# Altium footprint library Footprints.PcbLib: 266 footprints (part 11 of 17)
Each footprint in its own frame and in the unit in brackets; x right, y up, seen from the top. Pads: shape width x height; smd on the part's side, far side on the other; paste and mask are expansions set on the pad; w line width, h text height; cw(c..) or ccw(c..) is an arc to the next point about the centre after c.
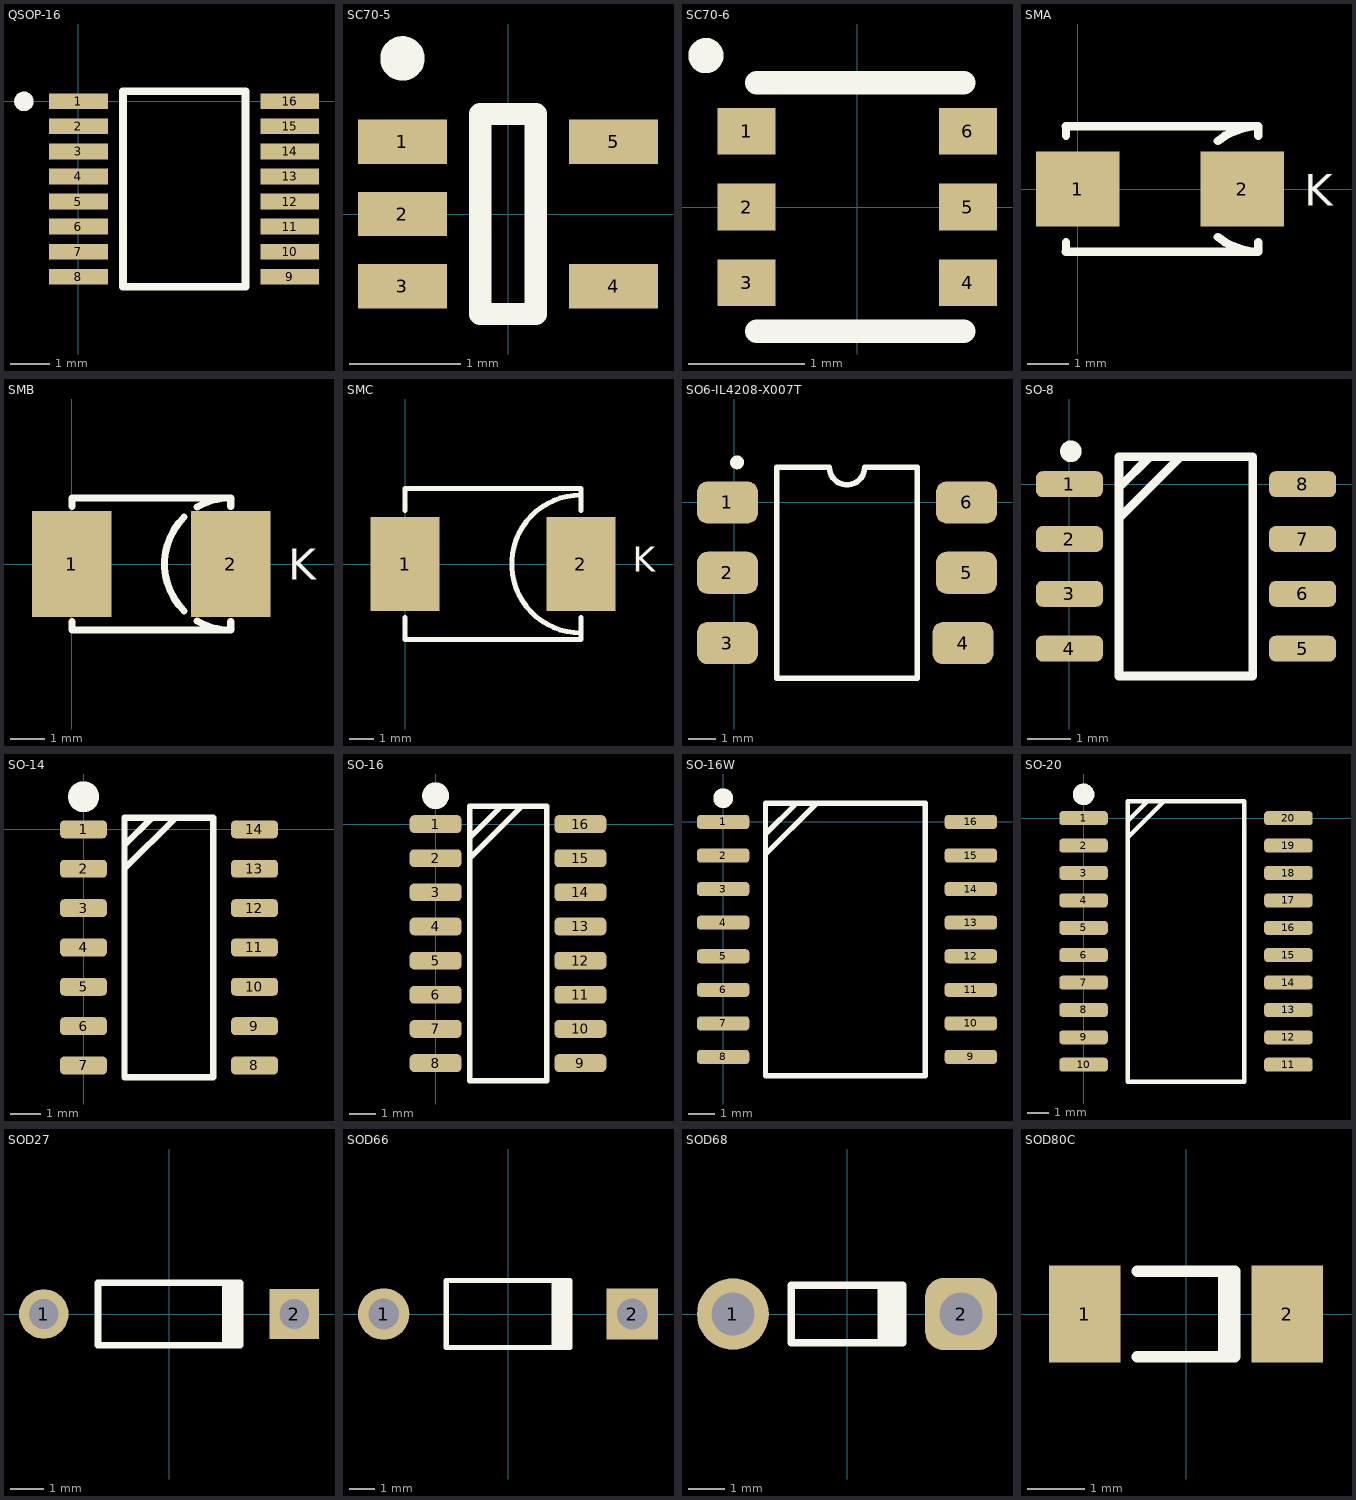
[diagram p10: the footprints below, top view; thin cyan lines are the x and y axes]

## QSOP-16 [mm] "QSOP, 16-Leads, Body 5.0x4.0mm (max), Pitch 0.64mm, IPC Medium Density"
height 1.75
pads (16):
  rect 1.5x0.4 smd: 1(0,0) 2(0,-0.64) 3(0,-1.28) 4(0,-1.92) 5(0,-2.56) 6(0,-3.2) 7(0,-3.84) 8(0,-4.48) 9(5.4,-4.48) 10(5.4,-3.84) 11(5.4,-3.2) 12(5.4,-2.56) 13(5.4,-1.92) 14(5.4,-1.28) 15(5.4,-0.64) 16(5.4,0)
Top Overlay:
  circle w0.25: c-1.395,0 r0.125
  lines w0.2: 1.143,-4.74 4.267,-4.74 4.267,0.26 1.143,0.26 1.143,-4.74
3D body "User Library-MAX_QSOP16.STEP": height 1.81, standoff 0.04, extent -0.292,-4.725 5.728,0.255

## SC70-5 [mm] "SC-70, 5-Leads"
height 1.1
pads (5):
  rect 0.8x0.4 smd: 1(-0.95,0.65) 2(-0.95,0) 3(-0.95,-0.65) 4(0.95,-0.65) 5(0.95,0.65)
Top Overlay:
  circle w0.2: c-0.95,1.4 r0.1
  lines w0.2: -0.25,-0.9 0.25,-0.9 0.25,0.9 -0.25,0.9 -0.25,-0.9
3D body "sot353.STEP": height 1, standoff 0, extent -1.15,-1.05 1.15,1.05

## SC70-6 [mm] "SC70-6, 6 pins, Height = 1mm"
height 1
pads (6):
  rect 0.5x0.4 smd: 1(-0.95,0.65) 2(-0.95,0) 3(-0.95,-0.65) 4(0.95,-0.65) 5(0.95,0) 6(0.95,0.65)
Top Overlay:
  circle w0.15: c-1.3,1.3 r0.076
  lines w0.2: -0.864,-1.067 0.914,-1.067 ; -0.864,1.067 0.914,1.067
3D body "SC70-6.STEP": height 0.92, standoff -0.03, extent -1.05,-1 1.05,1

## SMA [mm]
pads (2):
  rect 2x1.8 smd: 1(0,0) 2(3.937,0)
Top Overlay:
  lines w0.203: -0.282,-1.27 -0.282,-1.5 4.318,-1.5 ; -0.282,1.27 -0.282,1.5 4.318,1.5 ; 3.354,-1.149 ccw(c4.318,0) 4.318,-1.5 ; 3.354,1.149 cw(c4.318,0) 4.318,1.5 ; 4.318,-1.27 4.318,-1.5 ; 4.318,1.27 4.318,1.5
  text "K" at 5.42,-0.406 h0.76
3D body "SMA.STEP": height 2.4, standoff 0, extent -0.628,-1.321 4.572,1.279

## SMB [mil]
pads (2):
  rect 90x120 smd: 1(0,0) 2(180,0)
Top Overlay:
  lines w8: 0,-65 0,-75 180,-75 ; 0,65 0,75 180,75 ; 126.97,-53.03 cw(c180,0) 126.97,53.03 ; 142.02,-64.67 ccw(c180,0) 180,-75 ; 142.02,64.67 cw(c180,0) 180,75 ; 180,-65 180,-75 ; 180,65 180,75
  text "K" at 245,-18 h35
3D body "SMB.STEP": height 90.75, standoff 0, extent -14.6,-70 198,71.73

## SMC [mil]
pads (2):
  rect 110x150 smd: 1(0,0) 2(280,0)
Top Overlay:
  lines w8: 0,-85 0,-120 280,-120 280,-85 ; 0,85 0,120 280,120 280,85 ; 280,-110 cw(c280,0) 280,110
  text "K" at 362.98,-12.06 h40
3D body "SMC.STEP": height 90.75, standoff 0, extent -17.5,-117.28 295.5,115

## SO6-IL4208-X007T [mm]
height 1.75
pads (6):
  rrect50% 2.2x1.52 smd: 1(-0.254,0) 2(-0.254,-2.54) 3(-0.254,-5.08) 4(8.254,-5.08) 5(8.382,-2.54) 6(8.382,0)
Top Overlay:
  circle w0.25: c0.092,1.449 r0.125
  lines w0.203: 1.524,-6.35 1.524,1.27 3.429,1.27 ccw(c4.064,1.27) 4.699,1.27 6.604,1.27 6.604,-6.35 1.524,-6.35
3D body "User Library-N06C.step": height 3.82, standoff 0, extent -0.876,-6.1 9.004,1.02

## SO-8 [mm] "SOIC, 8-Leads, Pitch 1,27mm"
pads (8):
  rrect50% 1.55x0.6 smd: 1(0,0) 2(0,-1.27) 3(0,-2.54) 4(0,-3.81) 5(5.4,-3.81) 6(5.4,-2.54) 7(5.4,-1.27) 8(5.4,0)
Top Overlay:
  circle w0.25: c0.033,0.762 r0.125
  lines w0.203: 1.147,-0.791 2.573,0.635 ; 1.147,-0.076 1.859,0.635 ; 1.147,-4.445 1.147,0.635 4.246,0.635 4.246,-4.445 1.147,-4.445
3D body "SOIC-8.STEP": height 1.75, standoff 0, extent -0.3,-4.355 5.7,0.545

## SO-14 [mm] "SOIC, 14-Leads, Pitch 1,27mm"
pads (14):
  rrect50% 1.52x0.58 smd: 1(0,0) 2(0,-1.27) 3(0,-2.54) 4(0,-3.81) 5(0,-5.08) 6(0,-6.35) 7(0,-7.62) 8(5.52,-7.62) 9(5.52,-6.35) 10(5.52,-5.08) 11(5.52,-3.81) 12(5.52,-2.54) 13(5.52,-1.27) 14(5.52,0)
Top Overlay:
  circle w0.5: c0,1.054 r0.25
  lines w0.203: 1.321,-1.27 2.972,0.381 ; 1.321,-0.508 2.21,0.381 ; 1.321,-8.001 1.321,0.381 4.191,0.381 4.191,-8.001 1.321,-8.001
3D body "SOIC-14.STEP": height 1.75, standoff 0, extent -0.152,-8.085 5.648,0.465

## SO-16 [mil] "SOIC, 16-Leads, Pitch 1,27mm"
pads (16):
  rrect50% 76x26 smd: 1(0,0) 2(0,-50) 3(0,-100) 4(0,-150) 5(0,-200) 6(0,-250) 7(0,-300) 8(0,-350) 9(212,-350) 10(212,-300) 11(212,-250) 12(212,-200) 13(212,-150) 14(212,-100) 15(212,-50) 16(212,0)
Top Overlay:
  circle w19.68: c0,41.51 r9.84
  lines w8: 50,-50 125.83,25.83 ; 50,-20 95.83,25.83 ; 50,-375.83 50,25.83 163,25.83 163,-375.83 50,-375.83
3D body "SO-16.STEP": height 57, standoff 0, extent -13.88,-371.06 218.61,21.94

## SO-16W [mm] "SOIC, 16-Leads, 300mils Wide Body, Pitch 1,27mm, IPC Low Density"
height 2.65
pads (16):
  rrect50% 1.98x0.53 smd: 1(0,0) 2(0,-1.27) 3(0,-2.54) 4(0,-3.81) 5(0,-5.08) 6(0,-6.35) 7(0,-7.62) 8(0,-8.89) 9(9.37,-8.89) 10(9.37,-7.62) 11(9.37,-6.35) 12(9.37,-5.08) 13(9.37,-3.81) 14(9.37,-2.54) 15(9.37,-1.27) 16(9.37,0)
Top Overlay:
  circle w0.5: c0,0.9 r0.125
  lines w0.203: 1.6,-1.221 3.526,0.705 ; 1.6,-0.459 2.764,0.705 ; 1.6,-9.595 1.6,0.705 7.65,0.705 7.65,-9.595 1.6,-9.595
3D body "User Library-so16w.STEP": height 3.5, standoff 0, extent -0.451,-9.545 9.849,0.655

## SO-20 [mm] "SOIC, 20-Leads, Pitch 1,27mm"
height 2.65
pads (20):
  rrect50% 2.25x0.65 smd: 1(0,0) 2(0,-1.27) 3(0,-2.54) 4(0,-3.81) 5(0,-5.08) 6(0,-6.35) 7(0,-7.62) 8(0,-8.89) 9(0,-10.16) 10(0,-11.43) 11(9.5,-11.43) 12(9.5,-10.16) 13(9.5,-8.89) 14(9.5,-7.62) 15(9.5,-6.35) 16(9.5,-5.08) 17(9.5,-3.81) 18(9.5,-2.54) 19(9.5,-1.27) 20(9.5,0)
Top Overlay:
  circle w0.5: c0,1.105 r0.25
  lines w0.203: 2.054,-0.891 3.705,0.76 ; 2.054,-0.129 2.968,0.785 ; 2.054,-12.215 2.054,0.785 7.454,0.785 7.454,-12.215 2.054,-12.215
3D body "SO-20.STEP": height 2.65, standoff 0, extent -0.356,-12.09 9.944,0.71

## SOD27 [mm] "Diode, Axial; Body 4.3 x 1.9 mm (LxDia. max), Lead Dia. 0.56 mm (max)"
height 1.9
pads (2):
  round 1.5 hole 0.9: 1(-3.79,0)
  rect 1.5x1.5 hole 0.9: 2(3.79,0)
Top Overlay:
  rectangle: 1.6,-0.95 2.25,0.95
  lines w0.2: 2.15,-0.95 -2.15,-0.95 -2.15,0.95 2.15,0.95

## SOD66 [mm] "Diode, Axial; Body 4.8 x 2.6 mm (LxDia. max), Lead Dia. 0.81 mm (max)"
height 2.6
pads (2):
  round 2 hole 1.2: 1(-4.83,0)
  rect 2x2 hole 1.2: 2(4.83,0)
Top Overlay:
  rectangle: 1.7,-1.3 2.5,1.3
  lines w0.2: 2.4,-1.3 -2.4,-1.3 -2.4,1.3 2.4,1.3

## SOD68 [mm] "Diode, Axial; Body 3 x 1.6 mm (LxDia. max), Lead Dia. 0.55 mm (max)"
height 1.6
pads (2):
  round 2 hole 1.2: 1(-3.175,0)
  rrect50% 2x2 hole 1.2: 2(3.175,0)
Top Overlay:
  rectangle: 0.85,-0.8 1.65,0.8
  lines w0.2: 1.55,-0.8 -1.55,-0.8 -1.55,0.8 1.55,0.8
3D body: height 2.55, standoff 1.45, extent -0.698,-0.548 3.302,0.548
3D body: height 2.55, standoff 1.45, extent -3.175,-0.548 -0.175,0.548
3D body: height 3.6, standoff 0.4, extent 0.27,-1.594 1.27,1.594
3D body: height 3.6, standoff 0.4, extent -1.721,-1.594 0.279,1.594
3D body: height 2.55, standoff 1.45, extent -3.734,-0.548 -2.639,0.548
3D body: height 2.55, standoff 1.45, extent 2.766,-0.548 3.861,0.548
3D body: height 2, standoff -2, extent -3.748,-0.564 -2.653,0.533
3D body: height 2, standoff -2, extent 2.765,-0.523 3.861,0.574

## SOD80C [mm] "Metal Electrode Face (MELF) Diode; Body 3.5 x 1.6 mm (LxDia)"
height 1.6
pads (2):
  rect 1.25x1.7 smd: 1(-1.775,0) 2(1.775,0)
Top Overlay:
  lines w0.2: -0.85,-0.75 0.85,-0.75 0.85,0.75 -0.85,0.75 ; 0.66,-0.75 0.66,0.75